# Altium footprint library Connector.PcbLib: 536 footprints (part 23 of 34)
Each footprint in its own frame and in the unit in brackets; x right, y up, seen from the top. Pads: shape width x height; smd on the part's side, far side on the other; paste and mask are expansions set on the pad; w line width, h text height; cw(c..) or ccw(c..) is an arc to the next point about the centre after c.
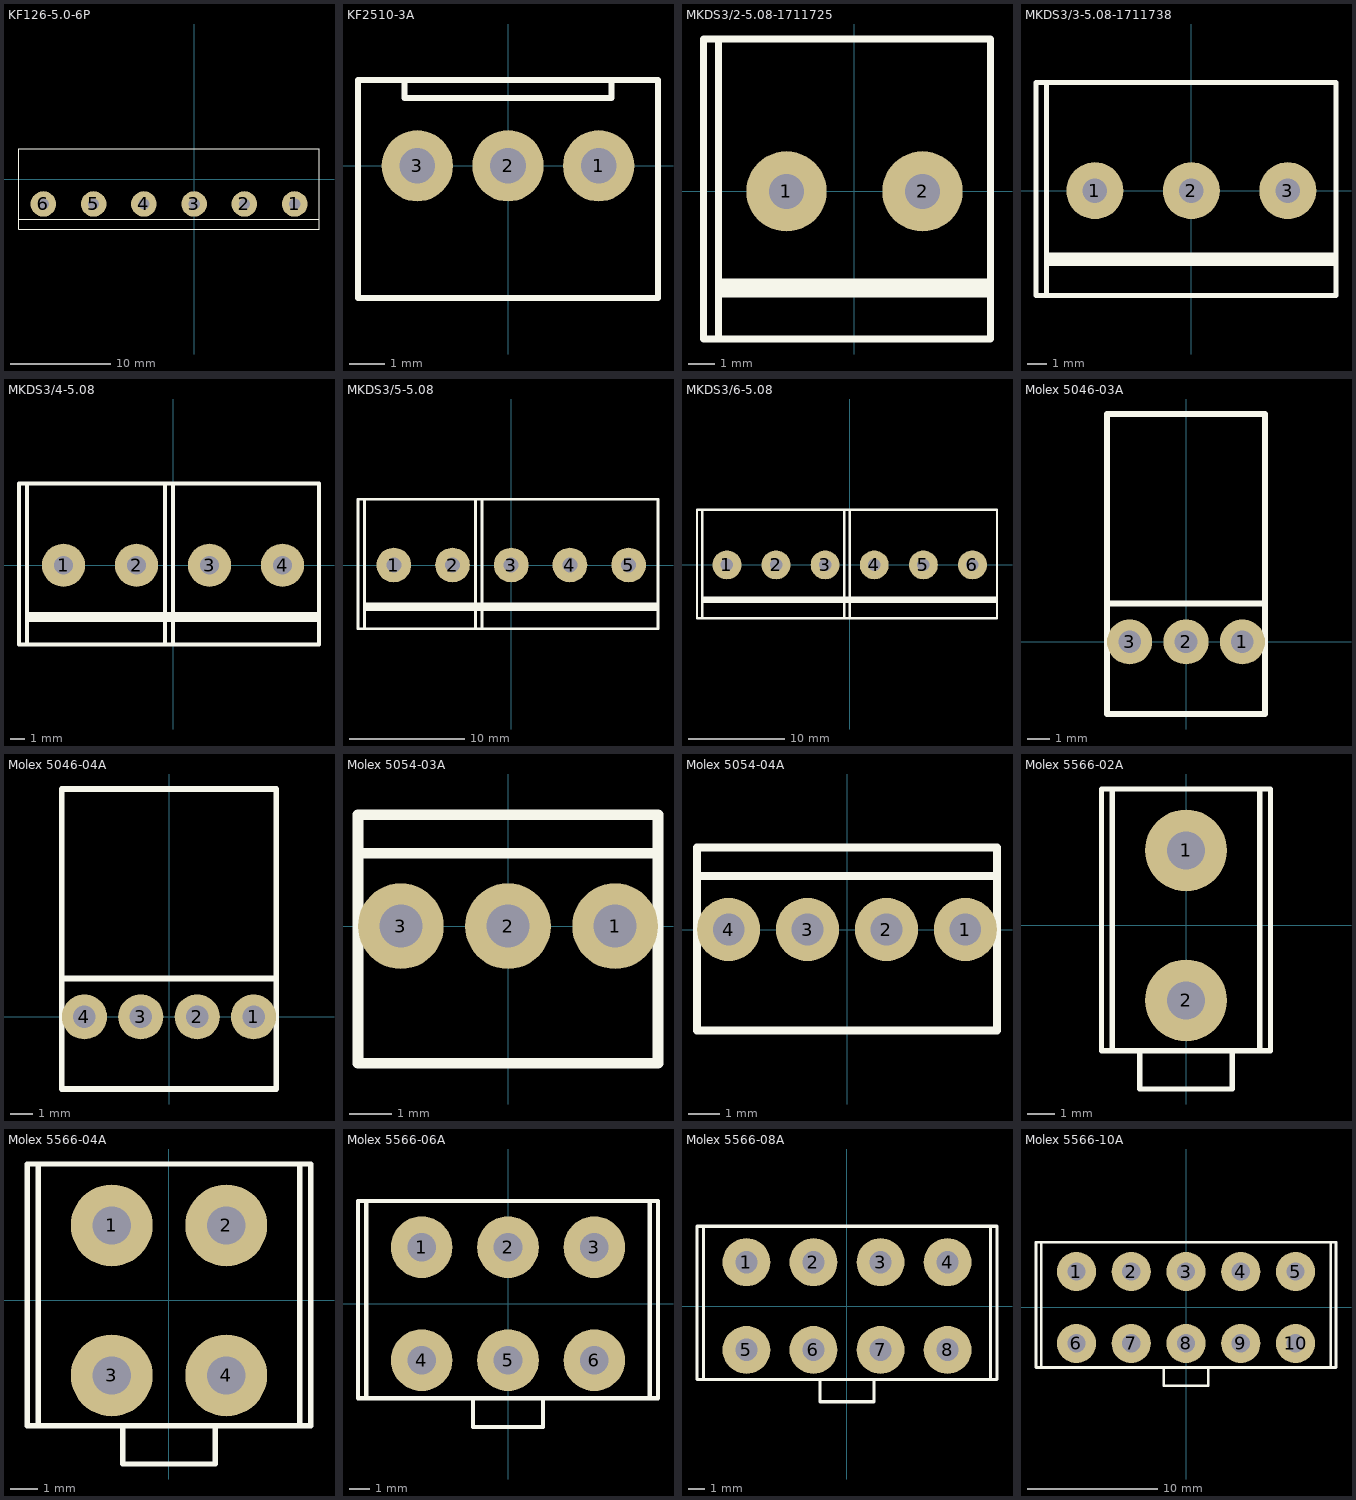
[diagram p22: the footprints below, top view; thin cyan lines are the x and y axes]

## KF126-5.0-6P [mil] "5.0mm"
pads (6):
  round 100 hole 44: 1(393.7,-97) 2(196.85,-97) 3(0,-97) 4(-196.85,-97) 5(-393.7,-97) 6(-590.55,-97)
Top Overlay:
  lines w3.94: -686,-156 489,-156 ; -686,-197 489,-197 489,120.09 -686,120.09 -686,-197
3D body "050-3.STEP": height 433.07, standoff -78.74, extent -685.36,-197.48 -94.81,117.48
3D body "050-3.STEP": height 433.07, standoff -78.74, extent -99.55,-197.48 491,117.48

## KF2510-3A [mm] "2.54MM"
pads (3):
  round 2 hole 1: 1(2.54,0) 2(0,0) 3(-2.54,0)
Top Overlay:
  lines w0.178: -2.9,2.4 -2.9,1.9 2.9,1.9 2.9,2.4 ; -4.2,-3.7 4.2,-3.7 4.2,-0.1 4.2,2.4 -4.2,2.4 -4.2,-0.1 -4.2,-3.7
3D body: height 12.5, standoff 0, extent -2.9,1.9 2.9,2.4
3D body: height 12.5, standoff -2.5, extent 2.14,-0.4 2.94,0.4
3D body: height 12.5, standoff -2.5, extent -0.4,-0.4 0.4,0.4
3D body: height 3.2, standoff 0, extent -4.14,-3.7 4.16,2.4
3D body: height 12.5, standoff -2.5, extent -2.94,-0.4 -2.14,0.4

## MKDS3/2-5.08-1711725 [mm]
pads (2):
  round 3 hole 1.3: 1(-2.54,0) 2(2.54,0)
Top Overlay:
  lines w0.254: -5.08,-3.835 5.08,-3.835 ; -5.08,-3.581 5.08,-3.581 ; -5.08,-3.378 5.08,-3.378 ; -5.08,-5.512 -5.639,-5.512 -5.639,5.69 -5.08,5.69 ; -5.08,-5.512 -5.08,5.69 ; -5.08,-5.512 5.08,-5.512 5.08,5.69 -5.08,5.69
3D body "MKDS 3 x 2.stp": height 18.3, standoff -5, extent -5.644,-5.51 5.086,5.69

## MKDS3/3-5.08-1711738 [mm]
pads (3):
  round 3 hole 1.3: 1(-5.08,0) 2(0,0) 3(5.08,0)
Top Overlay:
  lines w0.254: -7.62,-3.835 7.62,-3.835 ; -7.62,-3.581 7.62,-3.581 ; -7.62,-3.378 7.62,-3.378 ; -7.62,-5.512 -8.179,-5.512 -8.179,5.69 -7.62,5.69 ; -7.62,-5.512 -7.62,5.69 ; -7.62,-5.512 7.62,-5.512 7.62,5.69 -7.62,5.69
3D body "MKDS 3 x 3.stp": height 18.3, standoff -5, extent -8.184,-5.51 7.626,5.69

## MKDS3/4-5.08 [mm]
pads (4):
  round 3 hole 1.3: 1(-7.62,0) 2(-2.54,0) 3(2.54,0) 4(7.62,0)
Top Overlay:
  lines w0.254: -10.16,-3.835 10.16,-3.835 ; -10.16,-3.581 10.16,-3.581 ; -10.16,-3.378 10.16,-3.378 ; -10.16,-5.512 -10.719,-5.512 -10.719,5.69 -10.16,5.69 ; -10.16,-5.512 -10.16,5.69 ; -10.16,-5.512 10.16,-5.512 10.16,5.69 -10.16,5.69 ; -0.559,-5.512 -0.559,5.69 0,5.69 0,-5.512 -0.559,-5.512
3D body "MKDS 3 x 2.stp": height 18.3, standoff -5, extent -0.564,-5.51 10.166,5.69
3D body "MKDS 3 x 2.stp": height 18.3, standoff -5, extent -10.724,-5.51 0.006,5.69

## MKDS3/5-5.08 [mm]
pads (5):
  round 3 hole 1.3: 1(-10.16,0) 2(-5.08,0) 3(0,0) 4(5.08,0) 5(10.16,0)
Top Overlay:
  lines w0.254: -12.7,-3.835 12.7,-3.835 ; -12.7,-3.581 12.7,-3.581 ; -12.7,-3.378 12.7,-3.378 ; -12.7,-5.512 12.7,-5.512 12.7,5.69 -12.7,5.69 ; -12.7,-5.512 -12.7,5.69 ; -12.7,-5.512 -13.259,-5.512 -13.259,5.69 -12.7,5.69 ; -3.099,-5.512 -2.54,-5.512 -2.54,5.69 -3.099,5.69 -3.099,-5.512
3D body "MKDS 3 x 3.stp": height 18.3, standoff -5, extent -3.104,-5.51 12.706,5.69
3D body "MKDS 3 x 2.stp": height 18.3, standoff -5, extent -13.264,-5.51 -2.534,5.69

## MKDS3/6-5.08 [mm]
pads (6):
  round 3 hole 1.3: 1(-12.7,0) 2(-7.62,0) 3(-2.54,0) 4(2.54,0) 5(7.62,0) 6(12.7,0)
Top Overlay:
  lines w0.254: -15.24,-3.835 15.24,-3.835 ; -15.24,-3.581 15.24,-3.581 ; -15.24,-3.378 15.24,-3.378 ; -15.24,-5.512 -15.799,-5.512 -15.799,5.69 -15.24,5.69 ; -15.24,-5.512 -15.24,5.69 ; -15.24,-5.512 15.24,-5.512 15.24,5.69 -15.24,5.69 ; -0.559,-5.512 -0.559,5.69 0,5.69 0,-5.512 -0.559,-5.512
3D body "MKDS 3 x 3.stp": height 18.3, standoff -5, extent -15.804,-5.51 0.006,5.69
3D body "MKDS 3 x 3.stp": height 18.3, standoff -5, extent -0.564,-5.51 15.246,5.69

## Molex 5046-03A [mm] "2.54MM"
pads (3):
  round 2 hole 1: 1(2.5,0) 2(0,0) 3(-2.5,0)
Top Overlay:
  lines w0.254: -3.5,1.7 3.5,1.7 ; -3.5,-3.2 3.5,-3.2 3.5,10.1 -3.5,10.1 -3.5,-3.2
3D body "022051032.stp": height 6.37, standoff -3.35, extent -3.5,-3.2 3.5,10.1

## Molex 5046-04A [mm] "2.54MM"
pads (4):
  round 2 hole 1: 1(3.75,0) 2(1.25,0) 3(-1.25,0) 4(-3.75,0)
Top Overlay:
  lines w0.254: -4.75,1.7 4.75,1.7 ; -4.75,-3.2 -4.75,10.1 4.75,10.1 4.75,-3.2 -4.75,-3.2
3D body "022051042.stp": height 6.37, standoff -3.35, extent -4.75,-3.2 4.75,10.1

## Molex 5054-03A [mm] "2.54MM"
pads (3):
  round 2 hole 1: 1(2.5,0) 2(0,0) 3(-2.5,0)
Top Overlay:
  lines w0.254: -3.5,1.7 3.5,1.7 ; -3.5,-3.2 3.5,-3.2 3.5,2.6 -3.5,2.6 -3.5,-3.2
3D body "022041031.stp": height 11.75, standoff -3.35, extent -3.5,-3.2 3.5,2.6

## Molex 5054-04A [mm] "2.54MM"
pads (4):
  round 2 hole 1: 1(3.75,0) 2(1.25,0) 3(-1.25,0) 4(-3.75,0)
Top Overlay:
  lines w0.254: -4.75,1.7 4.75,1.7 ; -4.75,-3.2 -4.75,2.6 4.75,2.6 4.75,-3.2 -4.75,-3.2
3D body "022041041.stp": height 11.75, standoff -3.35, extent -4.75,-3.2 4.75,2.6

## Molex 5566-02A [mm]
pads (2):
  round 3 hole 1.4: 1(0,2.75) 2(0,-2.75)
Top Overlay:
  lines w0.2: -1.7,-4.604 -1.7,-6 1.7,-6 1.7,-4.604 ; -2.7,-4.6 -3.099,-4.6 -3.099,5 -2.7,5 ; -2.7,-4.6 2.7,-4.6 ; -2.7,-4.6 -2.7,5 ; -2.7,5 2.7,5 ; 2.7,-4.6 3.099,-4.6 3.099,5 2.7,5 ; 2.7,-4.6 2.7,5
3D body "5566-02A .stp": height 12.8, standoff -3.5, extent -3.1,-6 3.1,5

## Molex 5566-04A [mm]
pads (4):
  round 3 hole 1.4: 1(-2.1,2.75) 2(2.1,2.75) 3(-2.1,-2.75) 4(2.1,-2.75)
Top Overlay:
  lines w0.2: -1.7,-4.604 -1.7,-6 1.7,-6 1.7,-4.604 ; -4.8,-4.6 -5.199,-4.6 -5.199,5 -4.8,5 ; -4.8,-4.6 4.8,-4.6 ; -4.8,-4.6 -4.8,5 ; -4.8,5 4.8,5 ; 4.8,-4.6 4.8,5 ; 4.8,-4.6 5.199,-4.6 5.199,5 4.8,5
3D body "5566-04A .stp": height 12.8, standoff -3.5, extent -5.199,-6 5.201,5

## Molex 5566-06A [mm]
pads (6):
  round 3 hole 1.4: 1(-4.2,2.75) 2(0,2.75) 3(4.2,2.75) 4(-4.2,-2.75) 5(0,-2.75) 6(4.2,-2.75)
Top Overlay:
  lines w0.2: -1.7,-4.604 -1.7,-6 1.7,-6 1.7,-4.604 ; -6.9,-4.6 -6.9,5 ; -6.9,-4.6 6.9,-4.6 ; -6.9,-4.6 -7.299,-4.6 -7.299,5 -6.9,5 ; -6.9,5 6.9,5 ; 6.9,-4.6 6.9,5 ; 6.9,-4.6 7.299,-4.6 7.299,5 6.9,5
3D body "5566-06A .stp": height 12.8, standoff -3.5, extent -7.299,-6 7.301,5

## Molex 5566-08A [mm]
pads (8):
  round 3 hole 1.4: 1(-6.3,2.75) 2(-2.1,2.75) 3(2.1,2.75) 4(6.3,2.75) 5(-6.3,-2.75) 6(-2.1,-2.75) 7(2.1,-2.75) 8(6.3,-2.75)
Top Overlay:
  lines w0.2: -1.7,-4.604 -1.7,-6 1.7,-6 1.7,-4.604 ; -9,-4.6 -9,5 ; -9,-4.6 9,-4.6 ; -9,-4.6 -9.399,-4.6 -9.399,5 -9,5 ; -9,5 9,5 ; 9,-4.6 9.399,-4.6 9.399,5 9,5 ; 9,-4.6 9,5
3D body "5566-08A .stp": height 12.8, standoff -3.5, extent -9.399,-6 9.401,5

## Molex 5566-10A [mm]
pads (10):
  round 3 hole 1.4: 1(-8.4,2.75) 2(-4.2,2.75) 3(0,2.75) 4(4.2,2.75) 5(8.4,2.75) 6(-8.4,-2.75) 7(-4.2,-2.75) 8(0,-2.75) 9(4.2,-2.75) 10(8.4,-2.75)
Top Overlay:
  lines w0.2: -1.7,-4.604 -1.7,-6 1.7,-6 1.7,-4.604 ; -11.1,-4.6 -11.499,-4.6 -11.499,5 -11.1,5 ; -11.1,-4.6 11.1,-4.6 ; -11.1,-4.6 -11.1,5 ; -11.1,5 11.1,5 ; 11.1,-4.6 11.1,5 ; 11.1,-4.6 11.499,-4.6 11.499,5 11.1,5
3D body "5566-10A .stp": height 12.8, standoff -3.5, extent -11.499,-6 11.501,5